# Altium footprint library CommonFootprints_V1.PcbLib: 80 footprints (part 4 of 5)
Each footprint in its own frame and in the unit in brackets; x right, y up, seen from the top. Pads: shape width x height; smd on the part's side, far side on the other; paste and mask are expansions set on the pad; w line width, h text height; cw(c..) or ccw(c..) is an arc to the next point about the centre after c.
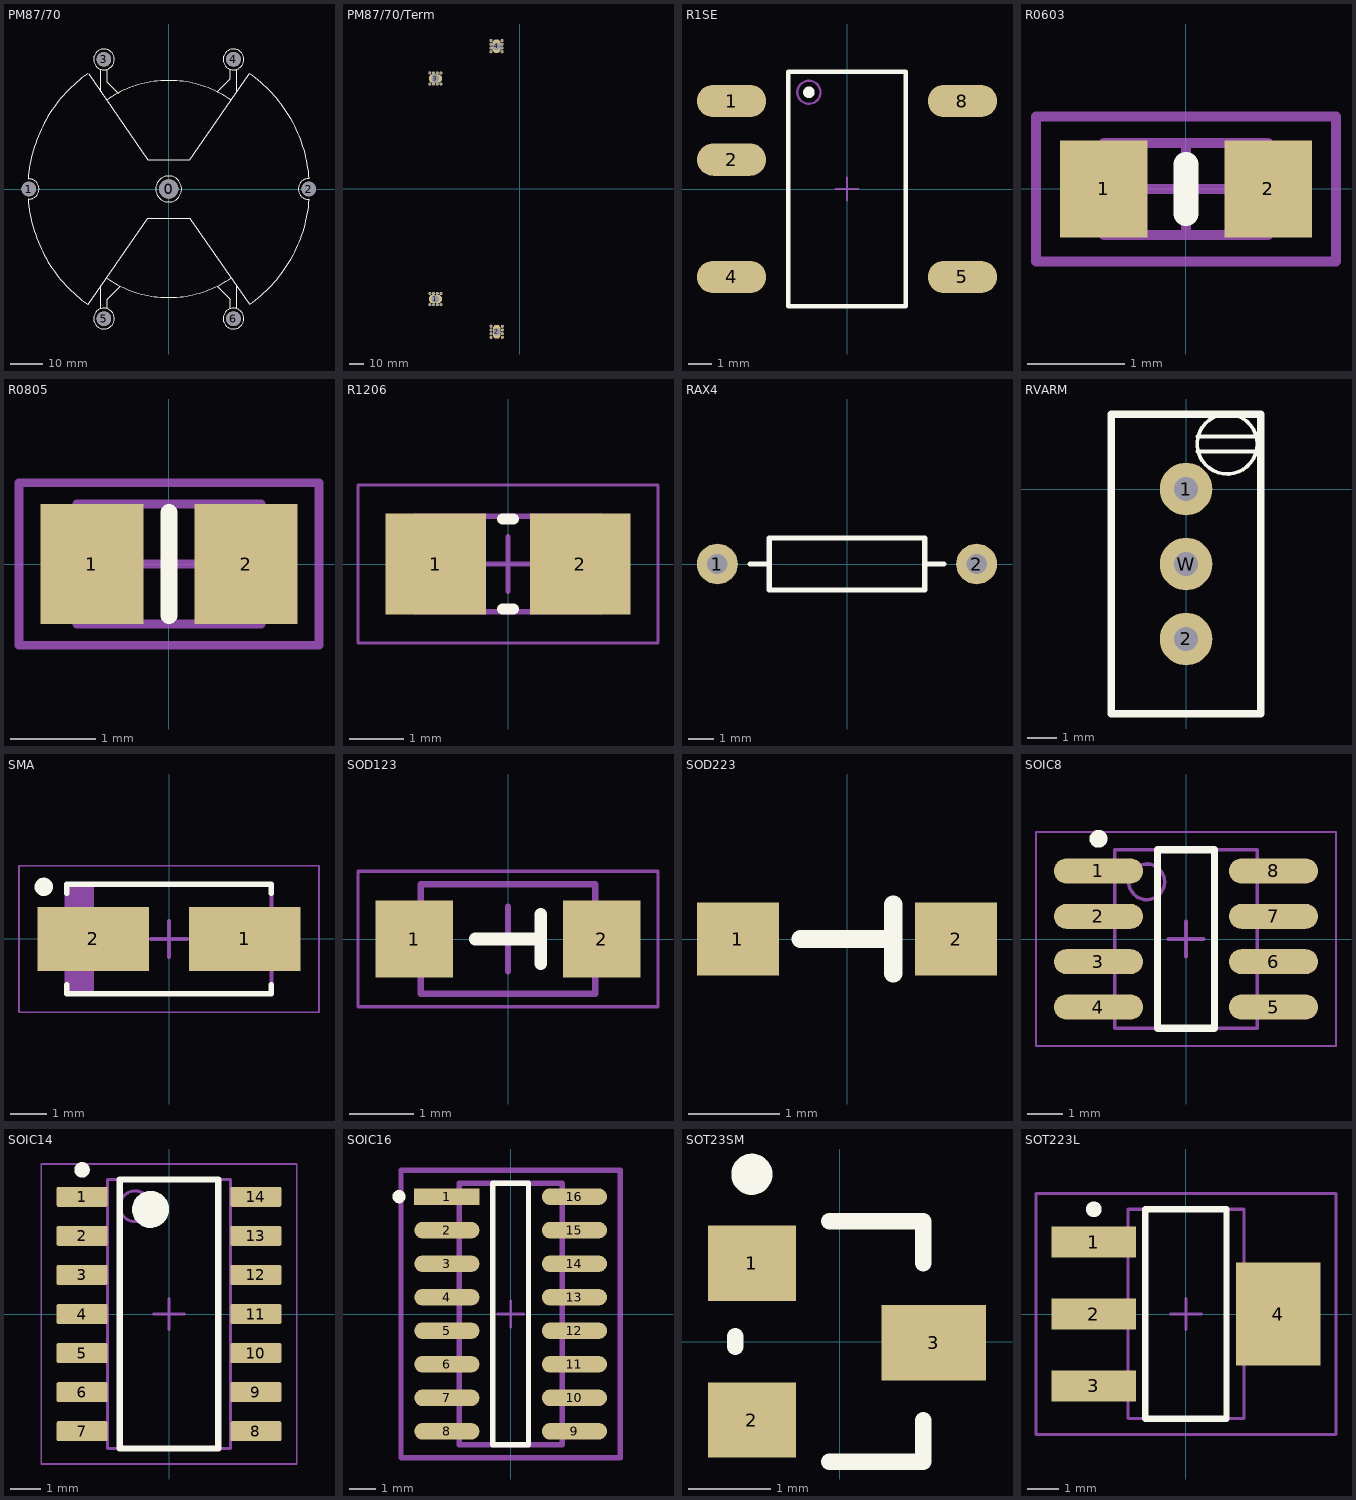
[diagram p3: the footprints below, top view; thin cyan lines are the x and y axes]

## PM87/70 [mm]
height 150
pads (7):
  round 6 hole 6 unplated: 0(0,0)
  round 4.5 hole 4.5 unplated: 1(-43.2,0) 2(43.2,0) 3(-20,40) 4(20,40) 5(-20,-40) 6(20,-40)
Top Overlay:
  circle w0.254: c20,-40 r3.2
  circle w0.254: c-20,-40 r3.2
  circle w0.254: c20,40 r3.2
  circle w0.254: c-20,40 r3.2
  circle w0.254: c0,0 r4
  lines w0.254: -43.405,3.087 cw(c-43.125,0) -43.392,-3.088 ; -43.391,-3.074 ccw(c0,0) -24.951,-35.633 ; -43.39,3.086 cw(c0,0) -24.951,35.633 ; -24.892,-35.56 -6.5,-9 6.5,-9 24.892,-35.433 ; -24.765,35.567 -6.5,9 6.5,9 24.892,35.567 ; -21,-37 -21,-29.94 ; -21,30.091 -21,34 -21,37 ; -19.252,-27.416 ccw(c0,0) 19.293,-27.387 ; -19.195,27.455 cw(c0,0) 19.147,27.489 ; -19,-37 -19,-34 -15,-30 ; -19,37 -19,34 -19,33 -15.625,29.625 ; 15,-30 19,-34 19,-37 ; 15,30 19,34 19,37 ; 21,-37 21,-30 ; 21,30 21,37 ; 24.951,-35.633 ccw(c0,0) 43.386,-3.151 ; 24.951,35.633 cw(c0,0) 43.384,3.174 ; 43.2,-3.2 cw(c43.2,0) 43.2,3.2
3D body: height 80, standoff 0, extent -43.633,-43.422 43.367,43.554

## PM87/70/Term [mm]
pads (36):
  round 2.1 hole 1.45: 1(-61.2,-78.81) 1(-61.2,-71.19) 1(-58.66,-78.81) 1(-58.66,-71.19) 1(-56.12,-78.81) 1(-56.12,-71.19) 1(-53.58,-78.81) 1(-53.58,-71.19) 2(-19.488,-101.106) 2(-19.488,-98.566) 2(-19.488,-96.026) 2(-19.488,-93.486) 2(-11.868,-101.106) 2(-11.868,-98.566) 2(-11.868,-96.026) 2(-11.868,-93.486) 3(-61.2,71.19) 3(-61.2,78.81) 3(-58.66,71.19) 3(-58.66,78.81) 3(-56.12,71.19) 3(-56.12,78.81) 3(-53.58,71.19) 3(-53.58,78.81) 4(-19.628,93.204) 4(-19.628,95.744) 4(-19.628,98.284) 4(-19.628,100.824) 4(-12.008,93.204) 4(-12.008,95.744) 4(-12.008,98.284) 4(-12.008,100.824)
  oct 9x5.3 hole 5.2: 1(-57.39,-75) 3(-57.39,75)
  oct 5.3x9 hole 5.2: 2(-15.678,-97.296) 4(-15.818,97.014)
Bottom Overlay:
  circle w0.254: c-20,-40 r3.2
  circle w0.254: c20,-40 r3.2
  circle w0.254: c-20,40 r3.2
  circle w0.254: c20,40 r3.2
  circle w0.254: c0,0 r4
  lines w0.254: -43.386,-3.151 ccw(c0,0) -24.951,-35.633 ; -43.384,3.174 cw(c0,0) -24.951,35.633 ; -43.2,-3.2 ccw(c-43.2,0) -43.2,3.2 ; -24.892,-35.433 -6.5,-9 6.5,-9 24.892,-35.56 ; -24.892,35.567 -6.5,9 6.5,9 24.765,35.567 ; -21,-37 -21,-30 ; -21,30 -21,37 ; -19.293,-27.387 ccw(c0,0) 19.252,-27.416 ; -19.147,27.489 cw(c0,0) 19.195,27.455 ; -19,-37 -19,-34 -15,-30 ; -19,37 -19,34 -15,30 ; 15,-30 19,-34 19,-37 ; 15.625,29.625 19,33 19,34 19,37 ; 21,-37 21,-29.94 ; 21,30.091 21,34 21,37 ; 24.951,-35.633 ccw(c0,0) 43.391,-3.074 ; 24.951,35.633 cw(c0,0) 43.39,3.086 ; 43.392,-3.088 cw(c43.125,0) 43.405,3.087 ; -61.89,-79.5 -61.89,-70.5 -52.89,-70.5 -52.89,-79.5 -61.89,-79.5 ; -61.89,70.5 -61.89,79.5 -52.89,79.5 -52.89,70.5 -61.89,70.5 ; -20.318,92.514 -20.318,101.514 -11.318,101.514 -11.318,92.514 -20.318,92.514 ; -20.178,-101.796 -20.178,-92.796 -11.178,-92.796 -11.178,-101.796 -20.178,-101.796
3D body: height 80, standoff 0, extent -43.367,-43.422 43.633,43.554
3D body "7460305.stp": height 7.05, standoff -3.45, extent -20.318,92.514 -11.318,101.514
3D body "7460305.stp": height 7.05, standoff -3.45, extent -61.89,70.5 -52.89,79.5
3D body "7460305.stp": height 7.05, standoff -3.45, extent -61.89,-79.5 -52.89,-70.5
3D body "7460305.stp": height 7.05, standoff -3.45, extent -20.178,-101.796 -11.178,-92.796

## R1SE [mm]
pads (5):
  oval 3x1.4 smd: 1(-5,3.81) 2(-5,1.27) 4(-5,-3.81) 5(5,-3.81) 8(5,3.81)
Top Overlay:
  circle w0.25: c-1.651,4.191 r0.125
  lines w0.2: -2.54,-5.08 2.54,-5.08 2.54,5.08 -2.54,5.08 -2.54,-5.08
Mechanical 13:
  circle w0.1: c-1.651,4.191 r0.5
  lines w0.1: -2.54,-5.08 -2.54,5.08 2.54,5.08 2.54,-5.08 -2.54,-5.08
Mechanical 15:
  lines w0.1: -0.5,0 0.5,0 ; 0,-0.5 0,0.5
3D body: height 1.75, standoff 0.1, extent -5.08,-5.08 5.08,5.08

## R0603 [mm]
pads (2):
  rect 0.9x1 smd: 1(-0.85,0) 2(0.85,0)
Top Overlay:
  lines w0.254: 0,-0.254 0,0.254
Mechanical 13:
  lines w0.1: -0.85,-0.475 0.85,-0.475 0.85,0.475 -0.85,0.475 -0.85,-0.475
Mechanical 15:
  lines w0.1: -0.475,0 0.475,0 ; 0,-0.475 0,0.475 ; -1.55,-0.75 1.55,-0.75 1.55,0.75 -1.55,0.75 -1.55,-0.75
3D body: height 0.6, standoff 0, extent -0.85,-0.475 0.85,0.475

## R0805 [mm]
pads (2):
  rect 1.2x1.4 smd: 1(-0.9,0) 2(0.9,0)
Top Overlay:
  lines w0.2: 0,-0.6 0,0.6
Mechanical 13:
  lines w0.1: -1.075,-0.7 1.075,-0.7 1.075,0.7 -1.075,0.7 -1.075,-0.7
Mechanical 15:
  lines w0.1: -0.5,0 0.5,0 ; 0,-0.5 0,0.5 ; -1.75,-0.95 1.75,-0.95 1.75,0.95 -1.75,0.95 -1.75,-0.95
3D body: height 0.65, standoff 0, extent -1.075,-0.7 1.075,0.7

## R1206 [mm] "Chip Resistor, 2-Leads, Body 3.20x1.60mm, IPC Low Density"
height 0.65
pads (2):
  rect 1.85x1.85 smd: 1(-1.325,0) 2(1.325,0)
Top Overlay:
  lines w0.2: -0.1,-0.825 0.1,-0.825 ; -0.1,0.825 0.1,0.825
Mechanical 13:
  lines w0.1: -1.7,-0.875 -1.7,0.875 1.7,0.875 1.7,-0.875 -1.7,-0.875
Mechanical 15:
  lines w0.05: -2.75,-1.45 -2.75,1.45 2.75,1.45 2.75,-1.45 -2.75,-1.45
  lines w0.1: -0.5,0 0.5,0 ; 0,-0.5 0,0.5
3D body: height 0.65, standoff 0, extent -0.8,-0.875 0.8,0.875
3D body: height 0.65, standoff 0, extent -1.7,-0.875 -0.8,0.875
3D body: height 0.65, standoff 0, extent 0.8,-0.875 1.7,0.875

## RAX4 [mm]
pads (2):
  round 1.6 hole 0.8: 1(-5.08,0) 2(5.08,0)
Top Overlay:
  lines w0.2: -3.81,0 -3.048,0 ; 3.048,0 3.81,0 ; -3.048,-1.016 -3.048,1.016 3.048,1.016 3.048,-1.016 -3.048,-1.016

## RVARM [mil]
pads (3):
  round 70 hole 32: 1(0,0) 2(0,-200) W(0,-100)
Top Overlay:
  circle w5: c55,60 r40
  lines w5: 15,50 95,50 ; 15,70 95,70
  lines w10: -100,-300 100,-300 100,100 -100,100 -100,-300

## SMA [mm] "Molded Diode, 2-Leads, Body 5.20x2.65mm, IPC Low Density"
height 2.4
pads (2):
  rect 3.05x1.75 smd: 1(2.075,0) 2(-2.075,0)
Top Overlay:
  circle w0.25: c-3.425,1.425 r0.125
  lines w0.15: -2.8,-1.25 -2.8,-1.5 2.8,-1.5 2.8,-1.25 ; -2.8,1.25 -2.8,1.5 2.8,1.5 2.8,1.25
Mechanical 13:
  rectangle: -2.8,-1.5 -2.047,1.5
  lines w0.1: -2.8,-1.5 -2.8,1.5 2.8,1.5 2.8,-1.5 -2.8,-1.5
Mechanical 15:
  lines w0.05: -4.1,-2 -4.1,2 4.1,2 4.1,-2 -4.1,-2
  lines w0.1: -0.5,0 0.5,0 ; 0,-0.5 0,0.5
3D body: height 2.4, standoff 0, extent -2.8,-1.5 2.8,1.5

## SOD123 [mm] "SODFL, 2-Leads, Body 1.60x3.50mm, IPC Low Density"
height 1.1
pads (2):
  rect 1.2x1.2 smd: 1(-1.45,0) 2(1.45,0)
Top Overlay:
  lines w0.2: -0.508,0 0.508,0 ; 0.508,-0.381 0.508,0.381
Mechanical 13:
  lines w0.1: -1.35,-0.85 1.35,-0.85 1.35,0.85 -1.35,0.85 -1.35,-0.85
Mechanical 15:
  lines w0.05: -2.325,-1.05 2.325,-1.05 2.325,1.05 -2.325,1.05 -2.325,-1.05
  lines w0.1: -0.5,0 0.5,0 ; 0,-0.5 0,0.5
3D body: height 1.1, standoff 0, extent -1.35,-0.85 1.35,0.85

## SOD223 [mm]
pads (2):
  rect 0.9x0.8 smd: 1(-1.2,0) 2(1.2,0)
Top Overlay:
  lines w0.2: -0.508,0 0.508,0 ; 0.508,-0.381 0.508,0.381
3D body "SOD323.STEP": height 1.1, standoff 0, extent -1.808,-0.802 0.792,0.548

## SOIC8 [mm]
pads (8):
  oval 2.5x0.7 smd: 1(-2.45,1.905) 2(-2.45,0.635) 3(-2.45,-0.635) 4(-2.45,-1.905) 5(2.45,-1.905) 6(2.45,-0.635) 7(2.45,0.635) 8(2.45,1.905)
Top Overlay:
  circle w0.25: c-2.45,2.805 r0.125
  lines w0.2: -0.8,-2.5 0.8,-2.5 0.8,2.5 -0.8,2.5 -0.8,-2.5
Mechanical 13:
  circle w0.1: c-1.1,1.6 r0.5
  lines w0.1: -2,-2.5 2,-2.5 2,2.5 -2,2.5 -2,-2.5
Mechanical 15:
  lines w0.05: -4.2,-3 4.2,-3 4.2,3 -4.2,3 -4.2,-3
  lines w0.1: -0.5,0 0.5,0 ; 0,-0.5 0,0.5
3D body "soic8_p1-27_l5-0_w4-0.stp": height 1.9, standoff 0, extent -3.1,-2.5 3.1,2.5

## SOIC14 [mm] "SOIC, 14-Leads, Body 8.75x4mm, Pitch 1.27mm, IPC Low Density"
height 1.75
pads (14):
  rrect15% 1.65x0.65 smd: 1(-2.825,3.81) 2(-2.825,2.54) 3(-2.825,1.27) 4(-2.825,0) 5(-2.825,-1.27) 6(-2.825,-2.54) 7(-2.825,-3.81) 8(2.825,-3.81) 9(2.825,-2.54) 10(2.825,-1.27) 11(2.825,0) 12(2.825,1.27) 13(2.825,2.54) 14(2.825,3.81)
Top Overlay:
  circle w0.6: c-0.6,3.4 r0.3
  circle w0.25: c-2.825,4.685 r0.125
  lines w0.2: -1.6,-4.375 1.6,-4.375 1.6,4.375 -1.6,4.375 -1.6,-4.375
Mechanical 13:
  circle w0.1: c-1.1,3.5 r0.5
  lines w0.1: -2,-4.375 2,-4.375 2,4.375 -2,4.375 -2,-4.375
Mechanical 15:
  lines w0.05: -4.15,-4.875 4.15,-4.875 4.15,4.875 -4.15,4.875 -4.15,-4.875
  lines w0.1: -0.5,0 0.5,0 ; 0,-0.5 0,0.5
3D body "SOIC-14akaD0014AakaM14A.stp": height 1.59, standoff -0.01, extent -3.023,-4.318 3.022,4.318

## SOIC16 [mm]
pads (16):
  rect 2.474x0.622 smd paste+0 mask+0: 1(-2.416,4.445)
  rrect100% 2.474x0.622 smd paste+0 mask+0: 2(-2.416,3.175) 3(-2.416,1.905) 4(-2.416,0.635) 5(-2.416,-0.635) 6(-2.416,-1.905) 7(-2.416,-3.175) 8(-2.416,-4.445) 9(2.416,-4.445) 10(2.416,-3.175) 11(2.416,-1.905) 12(2.416,-0.635) 13(2.416,0.635) 14(2.416,1.905) 15(2.416,3.175) 16(2.416,4.445)
Top Overlay:
  circle w0.25: c-4.228,4.445 r0.125
  lines w0.2: -0.679,-4.95 -0.679,4.95 0.679,4.95 0.679,-4.95 -0.679,-4.95
Mechanical 5:
  lines w0.2: -4.153,-5.45 -4.153,5.45 4.153,5.45 4.153,-5.45 -4.153,-5.45
  text ".Designator" at 0,0.188 h1
Mechanical 13:
  lines w0.2: -1.95,-4.95 -1.95,4.95 1.95,4.95 1.95,-4.95 -1.95,-4.95
Mechanical 15:
  lines w0.2: -4.153,-5.45 -4.153,5.45 4.153,5.45 4.153,-5.45 -4.153,-5.45
Mechanical 16:
  lines w0.1: -0.5,0 0.5,0 ; 0,-0.5 0,0.5
3D body "IC_Texas_Instruments_SN74HC595DR_eec.STEP": height 0.25, standoff 0, extent -4.153,-5.45 4.153,5.45

## SOT23SM [mil] "SOT23 Medium Intensity"
height 43.31
pads (3):
  rect 42x36 smd: 1(-42,37.49) 2(-42,-37.51)
  rect 50x36 smd: 3(45,-0.51)
Top Overlay:
  circle w9.84: c-42,80 r4.92
  lines w7.87: -50,-2.51 -50,2.49 ; -5,-57.51 40,-57.51 40,-37.51 ; -5,57.49 40,57.49 40,37.49
3D body "sot23.STEP": height 39.37, standoff 0, extent -46.06,-57.49 46.07,57.48

## SOT223L [mm] "SOT223/SC73, 4-Leads, Body 6.5x3.5mm, Pitch 2.3mm, Lead Span 7mm, IPC Low Density"
height 1.8
pads (4):
  rect 2.7x1 smd: 1(-2.95,2.3) 2(-2.95,0) 3(-2.95,-2.3)
  rect 2.7x3.3 smd: 4(2.95,0)
Top Overlay:
  circle w0.25: c-2.95,3.35 r0.125
  lines w0.2: -1.3,-3.35 -1.3,3.35 1.3,3.35 1.3,-3.35 -1.3,-3.35
Mechanical 13:
  lines w0.1: -1.85,-3.35 -1.85,3.35 1.85,3.35 1.85,-3.35 -1.85,-3.35
Mechanical 15:
  lines w0.1: -0.5,0 0.5,0 ; 0,-0.5 0,0.5 ; -4.8,-3.85 -4.8,3.85 4.8,3.85 4.8,-3.85 -4.8,-3.85
3D body: height 1.8, standoff 0, extent -1.85,-3.35 1.85,3.35